# Altium footprint library SparkFun-Connectors.PCBLIB: 409 footprints (part 3 of 26)
Each footprint in its own frame and in the unit in brackets; x right, y up, seen from the top. Pads: shape width x height; smd on the part's side, far side on the other; paste and mask are expansions set on the pad; w line width, h text height; cw(c..) or ccw(c..) is an arc to the next point about the centre after c.
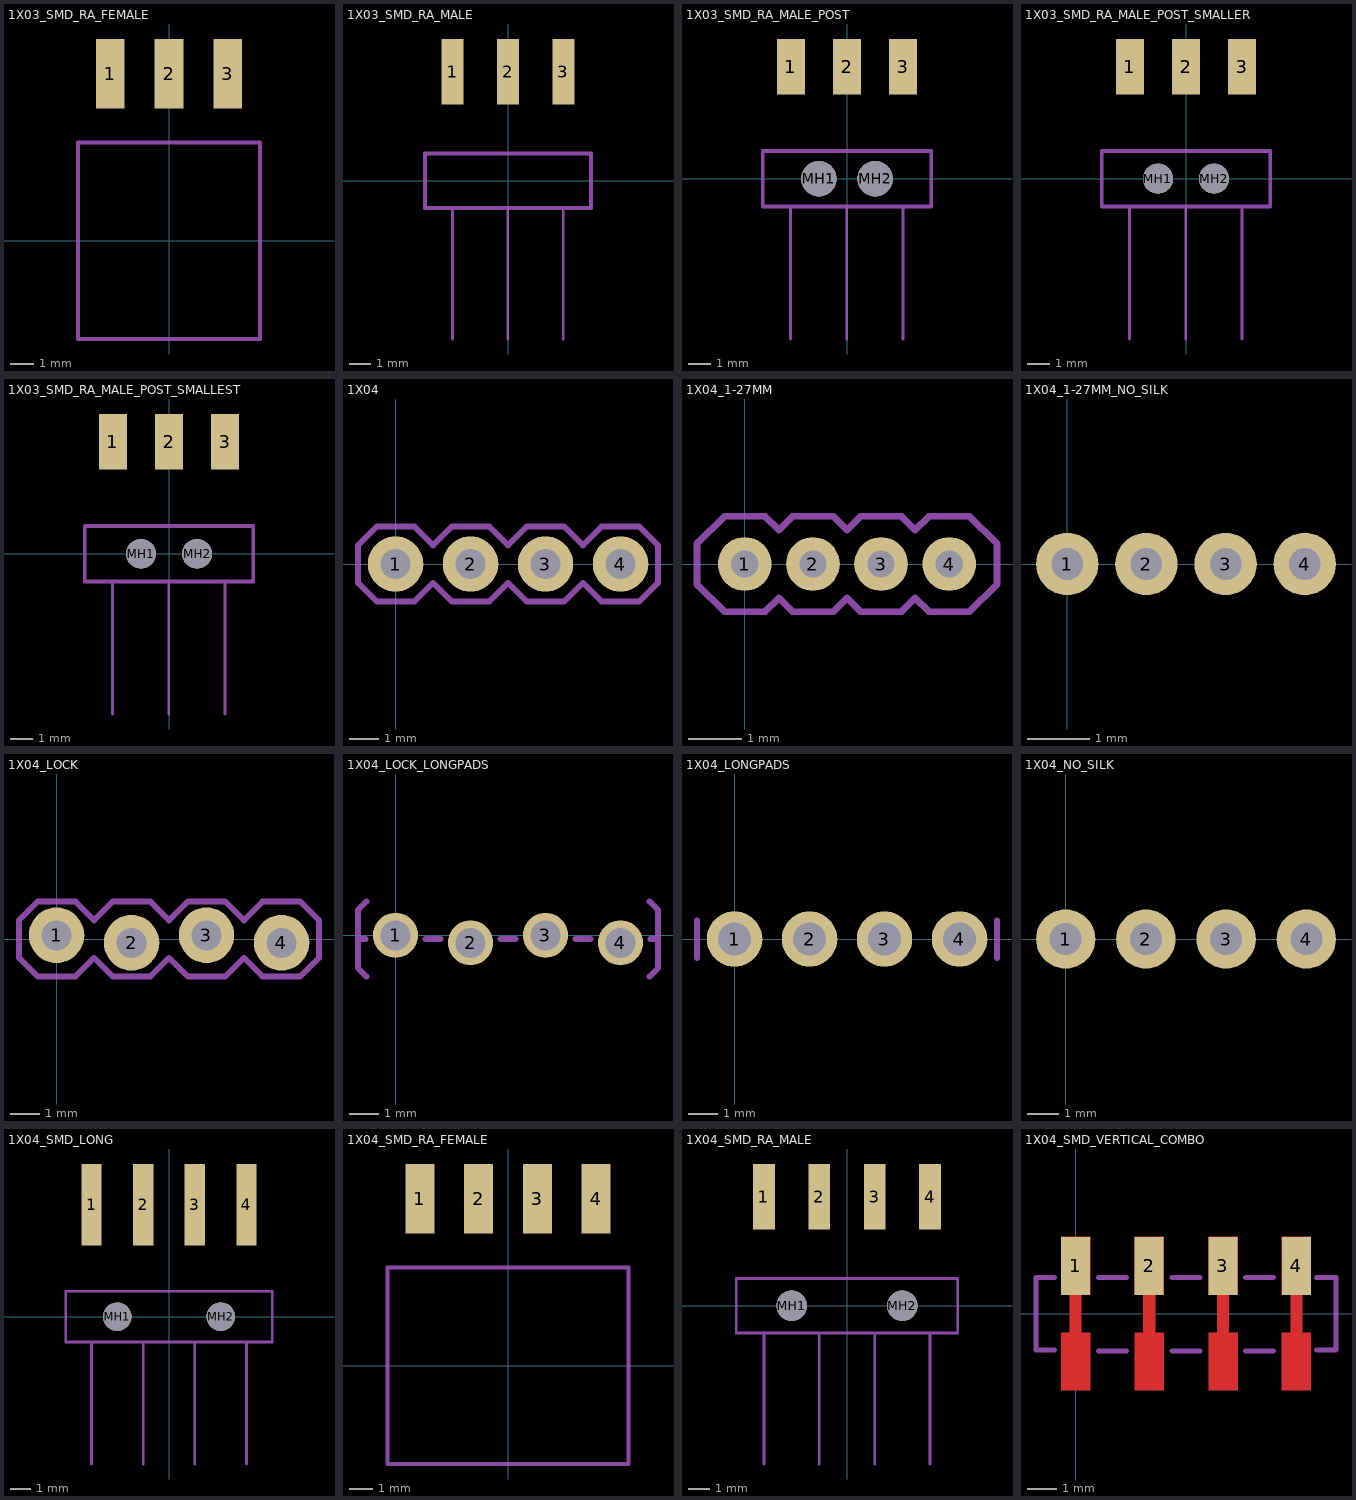
[diagram p2: the footprints below, top view; thin cyan lines are the x and y axes]

## 1X03_SMD_RA_FEMALE [mm]
pads (3):
  rect 1.25x3 smd: 1(-2.54,7.225) 2(0,7.225) 3(2.54,7.225)
tDocu:
  region: -0.32,6.8 -0.32,7.65 0.32,7.65 0.32,6.8
  region: 2.22,6.8 2.22,7.65 2.86,7.65 2.86,6.8
  region: -2.86,6.8 -2.86,7.65 -2.22,7.65 -2.22,6.8
tPlace:
  lines w0.178: -3.935,-4.25 -3.935,4.25 3.935,4.25 3.935,-4.25 -3.935,-4.25

## 1X03_SMD_RA_MALE [mm]
pads (3):
  rect 1x3 smd: 1(-2.54,5) 2(0,5) 3(2.54,5)
tDocu:
  region: -0.32,4.15 -0.32,5.95 0.32,5.95 0.32,4.15
  region: -2.86,4.15 -2.86,5.95 -2.22,5.95 -2.22,4.15
  region: 2.22,4.15 2.22,5.95 2.86,5.95 2.86,4.15
  lines w0.127: -2.55,-7.25 -2.55,-1.25 ; -0.01,-7.25 -0.01,-1.25 ; 2.53,-7.25 2.53,-1.25
  lines w0.178: -3.81,-1.25 -3.81,1.25 3.81,1.25 3.81,-1.25 2.53,-1.25 -0.01,-1.25 -2.55,-1.25 -3.81,-1.25

## 1X03_SMD_RA_MALE_POST [mil]
pads (5):
  rect 50x98.43 smd: 1(-100,199.61) 2(0,199.61) 3(100,199.61)
  round 62.99 hole 62.99 unplated: MH1(-50,0) MH2(50,0)
tDocu:
  region: -12.6,163.39 -12.6,234.25 12.6,234.25 12.6,163.39
  region: -112.6,163.39 -112.6,234.25 -87.4,234.25 -87.4,163.39
  region: 87.4,163.39 87.4,234.25 112.6,234.25 112.6,163.39
  lines w5: -100.39,-285.43 -100.39,-49.21 ; -0.39,-285.43 -0.39,-49.21 ; 99.61,-285.43 99.61,-49.21
  lines w7: -150,-49.21 -150,49.21 150,49.21 150,-49.21 99.61,-49.21 -0.39,-49.21 -100.39,-49.21 -150,-49.21

## 1X03_SMD_RA_MALE_POST_SMALLER [mil]
pads (5):
  rect 50x98.43 smd: 1(-100,199.61) 2(0,199.61) 3(100,199.61)
  round 53.5 hole 53.5 unplated: MH1(-50,0) MH2(50,0)
tDocu:
  region: -12.6,163.39 -12.6,234.25 12.6,234.25 12.6,163.39
  region: -112.6,163.39 -112.6,234.25 -87.4,234.25 -87.4,163.39
  region: 87.4,163.39 87.4,234.25 112.6,234.25 112.6,163.39
  lines w5: -100.39,-285.43 -100.39,-49.21 ; -0.39,-285.43 -0.39,-49.21 ; 99.61,-285.43 99.61,-49.21
  lines w7: -150,-49.21 -150,49.21 150,49.21 150,-49.21 99.61,-49.21 -0.39,-49.21 -100.39,-49.21 -150,-49.21

## 1X03_SMD_RA_MALE_POST_SMALLEST [mil]
pads (5):
  rect 50x98.43 smd: 1(-100,199.61) 2(0,199.61) 3(100,199.61)
  round 53 hole 53 unplated: MH1(-50,0) MH2(50,0)
tDocu:
  region: -12.6,163.39 -12.6,234.25 12.6,234.25 12.6,163.39
  region: -112.6,163.39 -112.6,234.25 -87.4,234.25 -87.4,163.39
  region: 87.4,163.39 87.4,234.25 112.6,234.25 112.6,163.39
  lines w5: -100.39,-285.43 -100.39,-49.21 ; -0.39,-285.43 -0.39,-49.21 ; 99.61,-285.43 99.61,-49.21
  lines w7: -150,-49.21 -150,49.21 150,49.21 150,-49.21 99.61,-49.21 -0.39,-49.21 -100.39,-49.21 -150,-49.21

## 1X04 [mil]
pads (4):
  round 74 hole 40: 1(0,0) 2(100,0) 3(200,0) 4(300,0)
tDocu:
  region: 290,-10 290,10 310,10 310,-10
  region: 190,-10 190,10 210,10 210,-10
  region: 90,-10 90,10 110,10 110,-10
  region: -10,-10 -10,10 10,10 10,-10
tPlace:
  lines w8: -50,-25 -50,25 -25,50 25,50 50,25 75,50 125,50 150,25 175,50 225,50 250,25 275,50 325,50 350,25 350,-25 325,-50 275,-50 250,-25 225,-50 175,-50 150,-25 125,-50 75,-50 50,-25 25,-50 -25,-50 -50,-25

## 1X04_1-27MM [mm]
pads (4):
  round 1 hole 0.508: 1(0,0) 2(1.27,0) 3(2.54,0) 4(3.81,0)
tPlace:
  lines w0.127: -0.889,-0.381 -0.381,-0.889 0.381,-0.889 0.635,-0.635 0.889,-0.889 1.651,-0.889 1.905,-0.635 2.159,-0.889 2.921,-0.889 3.175,-0.635 3.429,-0.889 4.191,-0.889 4.699,-0.381 4.699,0.381 4.191,0.889 3.429,0.889 3.175,0.635 2.921,0.889 2.159,0.889 1.905,0.635 1.651,0.889 0.889,0.889 0.635,0.635 0.381,0.889 -0.381,0.889 -0.889,0.381 -0.889,-0.381

## 1X04_1-27MM_NO_SILK [mm]
pads (4):
  round 1 hole 0.508: 1(0,0) 2(1.27,0) 3(2.54,0) 4(3.81,0)

## 1X04_LOCK [mil]
pads (4):
  round 74 hole 40: 1(0,5) 2(100,-5) 3(200,5) 4(300,-5)
tDocu:
  region: 290,-10 290,10 310,10 310,-10
  region: 190,-10 190,10 210,10 210,-10
  region: 90,-10 90,10 110,10 110,-10
  region: -10,-10 -10,10 10,10 10,-10
tPlace:
  lines w8: -50,-25 -50,25 -25,50 25,50 50,25 75,50 125,50 150,25 175,50 225,50 250,25 275,50 325,50 350,25 350,-25 325,-50 275,-50 250,-25 225,-50 175,-50 150,-25 125,-50 75,-50 50,-25 25,-50 -25,-50 -50,-25

## 1X04_LOCK_LONGPADS [mil]
pads (4):
  round 60 hole 40: 1(0,0) 2(100,-10) 3(200,0) 4(300,-10)
tDocu:
  region: -11.5,-16.5 -11.5,6.5 11.5,6.5 11.5,-16.5
  region: 88.5,-16.5 88.5,6.5 111.5,6.5 111.5,-16.5
  region: 188.5,-16.5 188.5,6.5 211.5,6.5 211.5,-16.5
  region: 311.5,-16.5 288.5,-16.5 288.5,6.5 311.5,6.5
tPlace:
  lines w8: -40,-5 -50,-5 ; -39,-55 -50,-44 -50,-5 ; -39,45 -50,34 -50,-5 ; 40,-5 60,-5 ; 140,-5 160,-5 ; 240,-5 260,-5 ; 339,-55 350,-44 350,-5 ; 339,45 350,34 350,-5 ; 340,-5 350,-5

## 1X04_LONGPADS [mil]
pads (4):
  round 74 hole 44: 1(0,0) 2(100,0) 3(200,0) 4(300,0)
tDocu:
  region: 290,-10 290,10 310,10 310,-10
  region: 190,-10 190,10 210,10 210,-10
  region: 90,-10 90,10 110,10 110,-10
  region: -10,-10 -10,10 10,10 10,-10
tPlace:
  lines w8: -50,-25 -50,25 ; 350,-25 350,25

## 1X04_NO_SILK [mil]
pads (4):
  round 74 hole 40: 1(0,0) 2(100,0) 3(200,0) 4(300,0)
tDocu:
  region: 290,-10 290,10 310,10 310,-10
  region: 190,-10 190,10 210,10 210,-10
  region: 90,-10 90,10 110,10 110,-10
  region: -10,-10 -10,10 10,10 10,-10

## 1X04_SMD_LONG [mm]
pads (6):
  rect 1x4 smd: 1(-3.81,5.5) 2(-1.27,5.5) 3(1.27,5.5) 4(3.81,5.5)
  round 1.4 hole 1.4 unplated: MH1(-2.54,0) MH2(2.54,0)
tDocu:
  lines w0.127: -3.81,-7.25 -3.81,-1.25 ; -1.27,-7.25 -1.27,-1.25 ; 1.27,-7.25 1.27,-1.25 ; 3.81,-7.25 3.81,-1.25 ; -3.81,-1.25 -5.08,-1.25 -5.08,1.25 5.08,1.25 5.08,-1.25 3.81,-1.25 ; -3.81,-1.25 -1.27,-1.25 ; -1.27,-1.25 1.27,-1.25 ; 1.27,-1.25 3.81,-1.25

## 1X04_SMD_RA_FEMALE [mm]
pads (4):
  rect 1.25x3 smd: 1(-3.81,7.225) 2(-1.27,7.225) 3(1.27,7.225) 4(3.81,7.225)
tDocu:
  region: -1.59,6.8 -1.59,7.65 -0.95,7.65 -0.95,6.8
  region: 0.95,6.8 0.95,7.65 1.59,7.65 1.59,6.8
  region: -4.13,6.8 -4.13,7.65 -3.49,7.65 -3.49,6.8
  region: 3.49,6.8 3.49,7.65 4.13,7.65 4.13,6.8
tPlace:
  lines w0.178: -5.205,-4.25 -5.205,4.25 5.205,4.25 5.205,-4.25 -5.205,-4.25

## 1X04_SMD_RA_MALE [mm]
pads (6):
  rect 1x3 smd: 1(-3.81,5) 2(-1.27,5) 3(1.27,5) 4(3.81,5)
  round 1.4 hole 1.4 unplated: MH1(-2.54,0) MH2(2.54,0)
tDocu:
  lines w0.127: -3.81,-7.25 -3.81,-1.25 ; -1.27,-7.25 -1.27,-1.25 ; 1.27,-7.25 1.27,-1.25 ; 3.81,-7.25 3.81,-1.25 ; -3.81,-1.25 -5.08,-1.25 -5.08,1.25 5.08,1.25 5.08,-1.25 3.81,-1.25 ; -3.81,-1.25 -1.27,-1.25 ; -1.27,-1.25 1.27,-1.25 ; 1.27,-1.25 3.81,-1.25

## 1X04_SMD_VERTICAL_COMBO [mm]
pads (4):
  rect 1x2 smd mask+0: 1(0,1.65) 2(2.54,1.65)
  rect 1x2 smd paste+0 mask+0: 3(5.08,1.65) 4(7.62,1.652)
Top:
  region: 2.04,2.65 3.04,2.65 3.04,0.65 2.74,0.65 2.74,-0.65 3.04,-0.65 3.04,-2.65 2.04,-2.65 2.04,-0.65 2.34,-0.65 2.34,0.65 2.04,0.65
  region: -0.5,2.65 0.5,2.65 0.5,0.65 0.2,0.65 0.2,-0.65 0.5,-0.65 0.5,-2.65 -0.5,-2.65 -0.5,-0.65 -0.2,-0.65 -0.2,0.65 -0.5,0.65
  region: 4.59,2.65 5.59,2.65 5.59,0.65 5.29,0.65 5.29,-0.65 5.59,-0.65 5.59,-2.65 4.59,-2.65 4.59,-0.65 4.89,-0.65 4.89,0.65 4.59,0.65
  region: 7.12,2.65 8.12,2.65 8.12,0.65 7.82,0.65 7.82,-0.65 8.12,-0.65 8.12,-2.65 7.12,-2.65 7.12,-0.65 7.42,-0.65 7.42,0.65 7.12,0.65
Top Paste:
  region: 3.12,-0.56 3.12,-2.76 1.92,-2.76 1.92,-0.56
  region: 3.14,2.74 3.14,0.54 1.94,0.54 1.94,2.74
  region: 0.58,-0.56 0.58,-2.76 -0.62,-2.76 -0.62,-0.56
  region: 0.6,2.74 0.6,0.54 -0.6,0.54 -0.6,2.74
  region: 5.67,-0.56 5.67,-2.76 4.47,-2.76 4.47,-0.56
  region: 5.69,2.74 5.69,0.54 4.49,0.54 4.49,2.74
  region: 8.2,-0.56 8.2,-2.76 7,-2.76 7,-0.56
  region: 8.22,2.74 8.22,0.54 7.02,0.54 7.02,2.74
Top Solder:
  region: 3.12,-0.56 3.12,-2.76 1.92,-2.76 1.92,-0.56
  region: 3.14,2.74 3.14,0.54 1.94,0.54 1.94,2.74
  region: 0.58,-0.56 0.58,-2.76 -0.62,-2.76 -0.62,-0.56
  region: 0.6,2.74 0.6,0.54 -0.6,0.54 -0.6,2.74
  region: 5.67,-0.56 5.67,-2.76 4.47,-2.76 4.47,-0.56
  region: 5.69,2.74 5.69,0.54 4.49,0.54 4.49,2.74
  region: 8.2,-0.56 8.2,-2.76 7,-2.76 7,-0.56
  region: 8.22,2.74 8.22,0.54 7.02,0.54 7.02,2.74
tPlace:
  lines w0.178: -0.73,-1.25 -1.37,-1.25 -1.37,1.25 -0.73,1.25 ; 0.789,-1.29 1.751,-1.29 ; 0.789,1.25 1.751,1.25 ; 3.329,-1.29 4.291,-1.29 ; 3.329,1.25 4.291,1.25 ; 5.869,-1.29 6.831,-1.29 ; 5.869,1.25 6.831,1.25 ; 8.32,-1.25 8.99,-1.25 8.99,1.25 8.32,1.25